# Altium schematic symbol library AliPadash.SchLib: 1186 symbols (part 5 of 6)
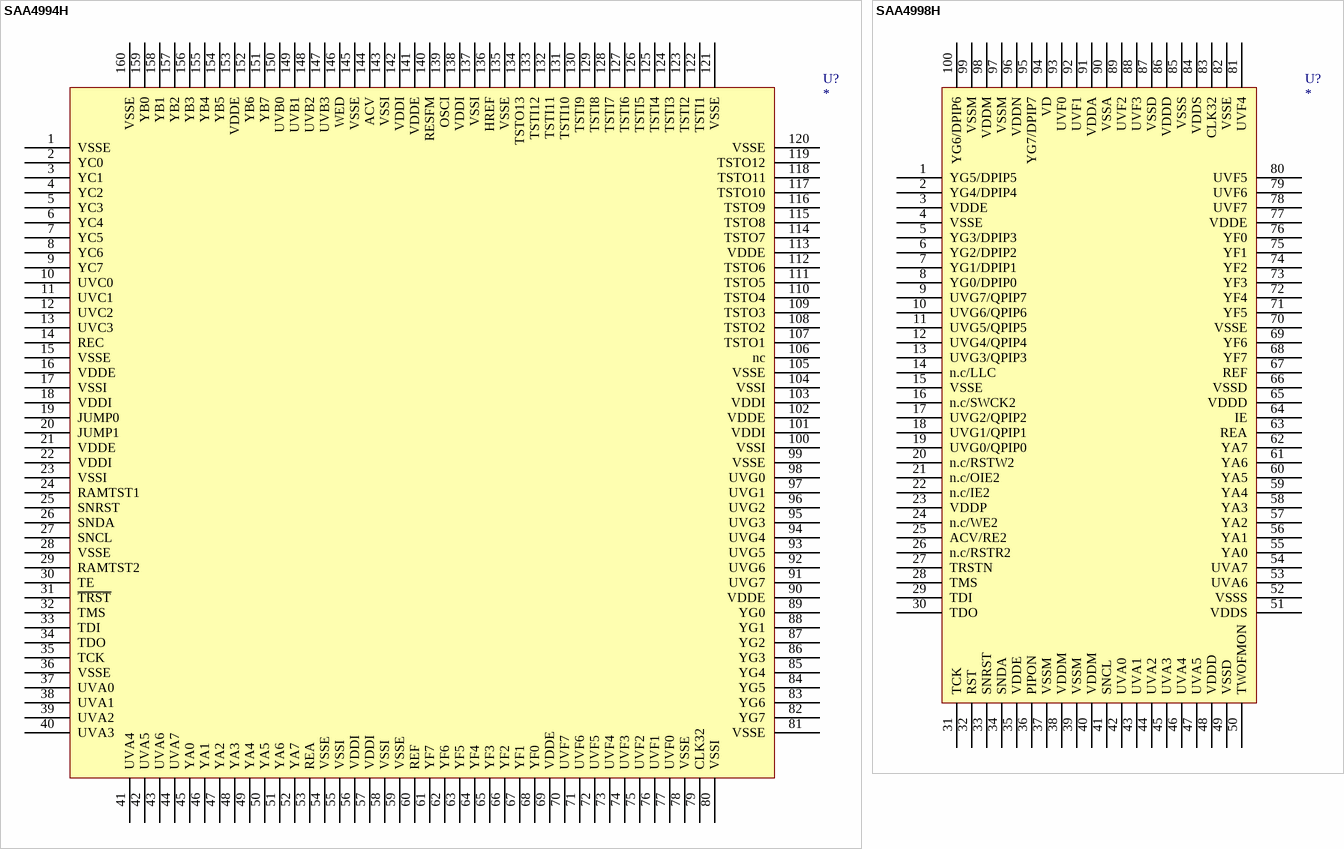
[diagram p90: symbols SAA4994H to SAA4998H]

## SAA4994H
designator U?
footprint QFP-160
pins: 1 VSSE, 2 YC0, 3 YC1, 4 YC2, 5 YC3, 6 YC4, 7 YC5, 8 YC6, 9 YC7, 10 UVC0, 11 UVC1, 12 UVC2, 13 UVC3, 14 REC, 15 VSSE, 16 VDDE, 17 VSSI, 18 VDDI, 19 JUMP0, 20 JUMP1, 21 VDDE, 22 VDDI, 23 VSSI, 24 RAMTST1, 25 SNRST, 26 SNDA, 27 SNCL, 28 VSSE, 29 RAMTST2, 30 TE, 31 ~{TRST}, 32 TMS, 33 TDI, 34 TDO, 35 TCK, 36 VSSE, 37 UVA0, 38 UVA1, 39 UVA2, 40 UVA3, 41 UVA4, 42 UVA5, 43 UVA6, 44 UVA7, 45 YA0, 46 YA1, 47 YA2, 48 YA3, 49 YA4, 50 YA5, 51 YA6, 52 YA7, 53 REA, 54 VSSE, 55 VSSI, 56 VDDI, 57 VDDI, 58 VSSI, 59 VSSE, 60 REF, 61 YF7, 62 YF6, 63 YF5, 64 YF4, 65 YF3, 66 YF2, 67 YF1, 68 YF0, 69 VDDE, 70 UVF7, 71 UVF6, 72 UVF5, 73 UVF4, 74 UVF3, 75 UVF2, 76 UVF1, 77 UVF0, 78 VSSE, 79 CLK32, 80 VSSI, 81 VSSE, 82 YG7, 83 YG6, 84 YG5, 85 YG4, 86 YG3, 87 YG2, 88 YG1, 89 YG0, 90 VDDE, 91 UVG7, 92 UVG6, 93 UVG5, 94 UVG4, 95 UVG3, 96 UVG2, 97 UVG1, 98 UVG0, 99 VSSE, 100 VSSI, 101 VDDI, 102 VDDE, 103 VDDI, 104 VSSI, 105 VSSE, 106 nc, 107 TSTO1, 108 TSTO2, 109 TSTO3, 110 TSTO4, 111 TSTO5, 112 TSTO6, 113 VDDE, 114 TSTO7, 115 TSTO8, 116 TSTO9, 117 TSTO10, 118 TSTO11, 119 TSTO12, 120 VSSE, 121 VSSE, 122 TSTI1, 123 TSTI2, 124 TSTI3, 125 TSTI4, 126 TSTI5, 127 TSTI6, 128 TSTI7, 129 TSTI8, 130 TSTI9, 131 TSTI10, 132 TSTI11, 133 TSTI12, 134 TSTO13, 135 VSSE, 136 HREF, 137 VSSI, 138 VDDI, 139 OSCI, 140 RESFM, 141 VDDE, 142 VDDI, 143 VSSI, 144 ACV, 145 VSSE, 146 WED, 147 UVB3, 148 UVB2, 149 UVB1, 150 UVB0, 151 YB7, 152 YB6, 153 VDDE, 154 YB5, 155 YB4, 156 YB3, 157 YB2, 158 YB1, 159 YB0, 160 VSSE

## SAA4998H
designator U?
footprint SOT317-2
pins: 1 YG5/DPIP5, 2 YG4/DPIP4, 3 VDDE, 4 VSSE, 5 YG3/DPIP3, 6 YG2/DPIP2, 7 YG1/DPIP1, 8 YG0/DPIP0, 9 UVG7/QPIP7, 10 UVG6/QPIP6, 11 UVG5/QPIP5, 12 UVG4/QPIP4, 13 UVG3/QPIP3, 14 n.c/LLC, 15 VSSE, 16 n.c/SWCK2, 17 UVG2/QPIP2, 18 UVG1/QPIP1, 19 UVG0/QPIP0, 20 n.c/RSTW2, 21 n.c/OIE2, 22 n.c/IE2, 23 VDDP, 24 n.c/WE2, 25 ACV/RE2, 26 n.c/RSTR2, 27 TRSTN, 28 TMS, 29 TDI, 30 TDO, 31 TCK, 32 RST, 33 SNRST, 34 SNDA, 35 VDDE, 36 PIPON, 37 VSSM, 38 VDDM, 39 VSSM, 40 VDDM, 41 SNCL, 42 UVA0, 43 UVA1, 44 UVA2, 45 UVA3, 46 UVA4, 47 UVA5, 48 VDDD, 49 VSSD, 50 TWOFMON, 51 VDDS, 52 VSSS, 53 UVA6, 54 UVA7, 55 YA0, 56 YA1, 57 YA2, 58 YA3, 59 YA4, 60 YA5, 61 YA6, 62 YA7, 63 REA, 64 IE, 65 VDDD, 66 VSSD, 67 REF, 68 YF7, 69 YF6, 70 VSSE, 71 YF5, 72 YF4, 73 YF3, 74 YF2, 75 YF1, 76 YF0, 77 VDDE, 78 UVF7, 79 UVF6, 80 UVF5, 81 UVF4, 82 VSSE, 83 CLK32, 84 VDDS, 85 VSSS, 86 VDDD, 87 VSSD, 88 UVF3, 89 UVF2, 90 VSSA, 91 VDDA, 92 UVF1, 93 UVF0, 94 VD, 95 YG7/DPIP7, 96 VDDN, 97 VSSM, 98 VDDM, 99 VSSM, 100 YG6/DPIP6

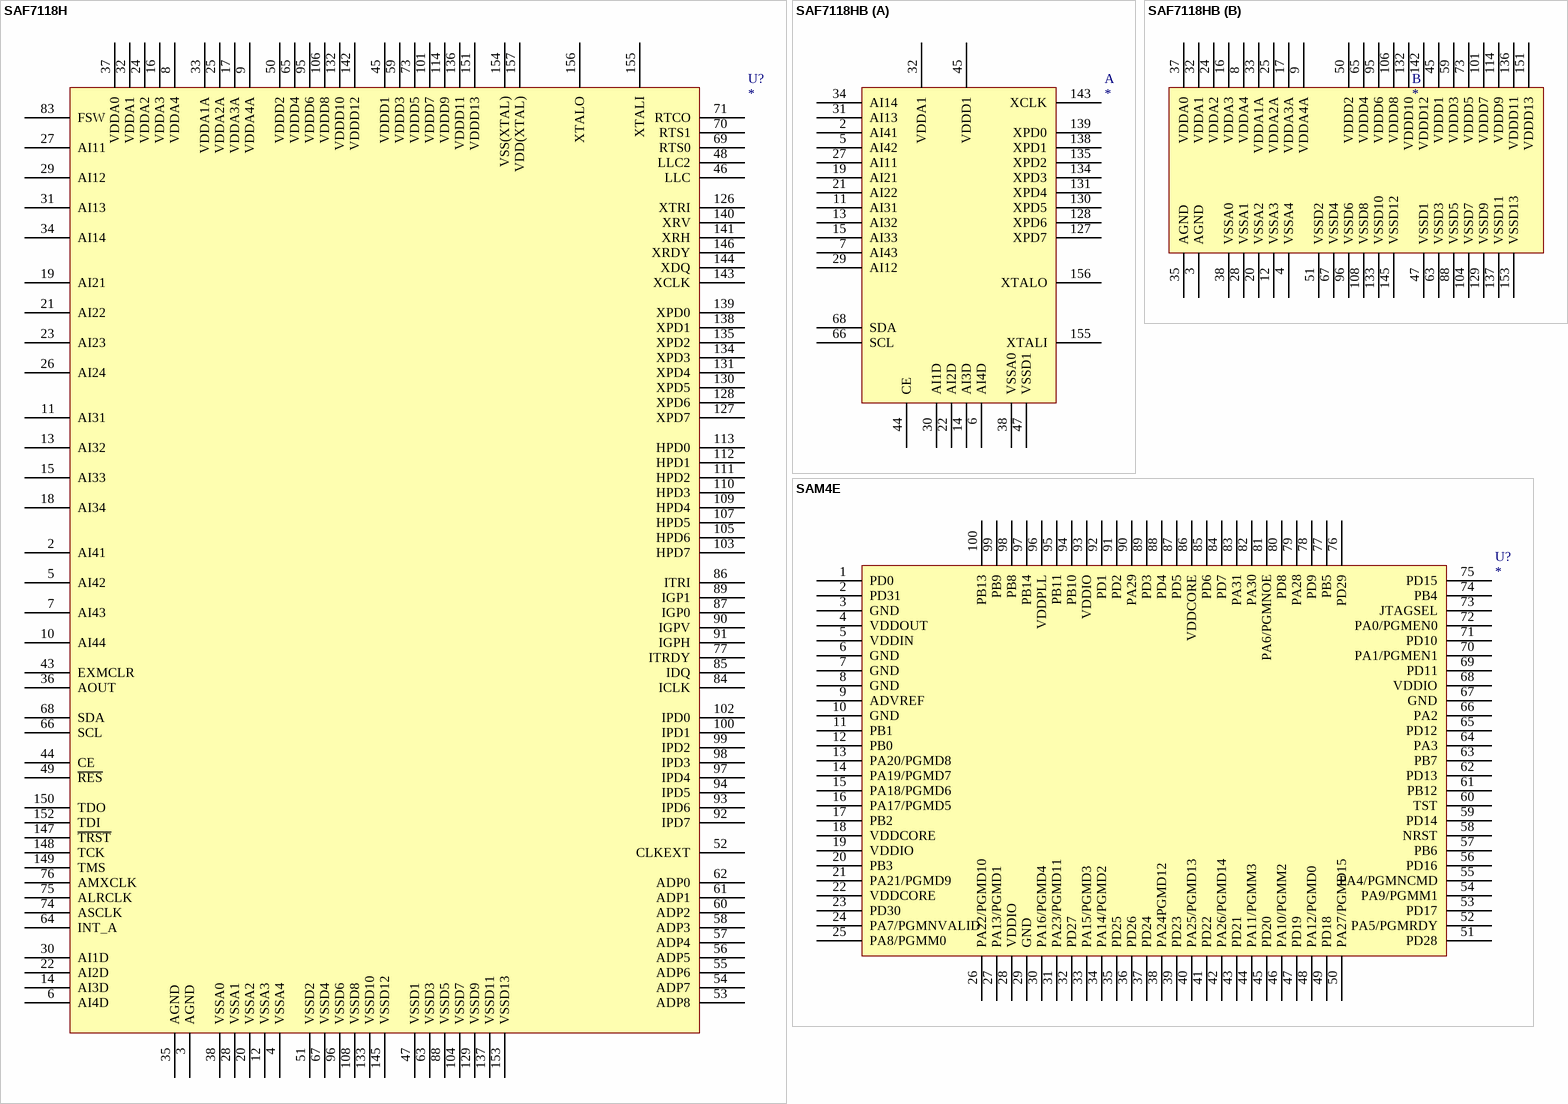
[diagram p56: symbols SAF7118H to SAM4E]

## SAF7118H
designator U?
footprint QFP160
pins: 2 AI41, 3 AGND, 4 VSSA4, 5 AI42, 6 AI4D, 7 AI43, 8 VDDA4, 9 VDDA4A, 10 AI44, 11 AI31, 12 VSSA3, 13 AI32, 14 AI3D, 15 AI33, 16 VDDA3, 17 VDDA3A, 18 AI34, 19 AI21, 20 VSSA2, 21 AI22, 22 AI2D, 23 AI23, 24 VDDA2, 25 VDDA2A, 26 AI24, 27 AI11, 28 VSSA1, 29 AI12, 30 AI1D, 31 AI13, 32 VDDA1, 33 VDDA1A, 34 AI14, 35 AGND, 36 AOUT, 37 VDDA0, 38 VSSA0, 43 EXMCLR, 44 CE, 45 VDDD1, 46 LLC, 47 VSSD1, 48 LLC2, 49 ~{RES}, 50 VDDD2, 51 VSSD2, 52 CLKEXT, 53 ADP8, 54 ADP7, 55 ADP6, 56 ADP5, 57 ADP4, 58 ADP3, 59 VDDD3, 60 ADP2, 61 ADP1, 62 ADP0, 63 VSSD3, 64 INT_A, 65 VDDD4, 66 SCL, 67 VSSD4, 68 SDA, 69 RTS0, 70 RTS1, 71 RTCO, 73 VDDD5, 74 ASCLK, 75 ALRCLK, 76 AMXCLK, 77 ITRDY, 83 FSW, 84 ICLK, 85 IDQ, 86 ITRI, 87 IGP0, 88 VSSD5, 89 IGP1, 90 IGPV, 91 IGPH, 92 IPD7, 93 IPD6, 94 IPD5, 95 VDDD6, 96 VSSD6, 97 IPD4, 98 IPD3, 99 IPD2, 100 IPD1, 101 VDDD7, 102 IPD0, 103 HPD7, 104 VSSD7, 105 HPD6, 106 VDDD8, 107 HPD5, 108 VSSD8, 109 HPD4, 110 HPD3, 111 HPD2, 112 HPD1, 113 HPD0, 114 VDDD9, 126 XTRI, 127 XPD7, 128 XPD6, 129 VSSD9, 130 XPD5, 131 XPD4, 132 VDDD10, 133 VSSD10, 134 XPD3, 135 XPD2, 136 VDDD11, 137 VSSD11, 138 XPD1, 139 XPD0, 140 XRV, 141 XRH, 142 VDDD12, 143 XCLK, 144 XDQ, 145 VSSD12, 146 XRDY, 147 ~{TRST}, 148 TCK, 149 TMS, 150 TDO, 151 VDDD13, 152 TDI, 153 VSSD13, 154 VSS(XTAL), 155 XTALI, 156 XTALO, 157 VDD(XTAL)

## SAF7118HB
designator ?
part A pins: 2 AI41, 5 AI42, 6 AI4D, 7 AI43, 11 AI31, 13 AI32, 14 AI3D, 15 AI33, 19 AI21, 21 AI22, 22 AI2D, 27 AI11, 29 AI12, 30 AI1D, 31 AI13, 32 VDDA1, 34 AI14, 38 VSSA0, 44 CE, 45 VDDD1, 47 VSSD1, 66 SCL, 68 SDA, 127 XPD7, 128 XPD6, 130 XPD5, 131 XPD4, 134 XPD3, 135 XPD2, 138 XPD1, 139 XPD0, 143 XCLK, 155 XTALI, 156 XTALO
part B pins: 3 AGND, 4 VSSA4, 8 VDDA4, 9 VDDA4A, 12 VSSA3, 16 VDDA3, 17 VDDA3A, 20 VSSA2, 24 VDDA2, 25 VDDA2A, 28 VSSA1, 32 VDDA1, 33 VDDA1A, 35 AGND, 37 VDDA0, 38 VSSA0, 45 VDDD1, 47 VSSD1, 50 VDDD2, 51 VSSD2, 59 VDDD3, 63 VSSD3, 65 VDDD4, 67 VSSD4, 73 VDDD5, 88 VSSD5, 95 VDDD6, 96 VSSD6, 101 VDDD7, 104 VSSD7, 106 VDDD8, 108 VSSD8, 114 VDDD9, 129 VSSD9, 132 VDDD10, 133 VSSD10, 136 VDDD11, 137 VSSD11, 142 VDDD12, 145 VSSD12, 151 VDDD13, 153 VSSD13

## SAM4E
designator U?
footprint LQFP100
pins: 1 PD0, 2 PD31, 3 GND, 4 VDDOUT, 5 VDDIN, 6 GND, 7 GND, 8 GND, 9 ADVREF, 10 GND, 11 PB1, 12 PB0, 13 PA20/PGMD8, 14 PA19/PGMD7, 15 PA18/PGMD6, 16 PA17/PGMD5, 17 PB2, 18 VDDCORE, 19 VDDIO, 20 PB3, 21 PA21/PGMD9, 22 VDDCORE, 23 PD30, 24 PA7/PGMNVALID, 25 PA8/PGMM0, 26 PA22/PGMD10, 27 PA13/PGMD1, 28 VDDIO, 29 GND, 30 PA16/PGMD4, 31 PA23/PGMD11, 32 PD27, 33 PA15/PGMD3, 34 PA14/PGMD2, 35 PD25, 36 PD26, 37 PD24, 38 PA24PGMD12, 39 PD23, 40 PA25/PGMD13, 41 PD22, 42 PA26/PGMD14, 43 PD21, 44 PA11/PGMM3, 45 PD20, 46 PA10/PGMM2, 47 PD19, 48 PA12/PGMD0, 49 PD18, 50 PA27/PGMD15, 51 PD28, 52 PA5/PGMRDY, 53 PD17, 54 PA9/PGMM1, 55 PA4/PGMNCMD, 56 PD16, 57 PB6, 58 NRST, 59 PD14, 60 TST, 61 PB12, 62 PD13, 63 PB7, 64 PA3, 65 PD12, 66 PA2, 67 GND, 68 VDDIO, 69 PD11, 70 PA1/PGMEN1, 71 PD10, 72 PA0/PGMEN0, 73 JTAGSEL, 74 PB4, 75 PD15, 76 PD29, 77 PB5, 78 PD9, 79 PA28, 80 PD8, 81 PA6/PGMNOE, 82 PA30, 83 PA31, 84 PD7, 85 PD6, 86 VDDCORE, 87 PD5, 88 PD4, 89 PD3, 90 PA29, 91 PD2, 92 PD1, 93 VDDIO, 94 PB10, 95 PB11, 96 VDDPLL, 97 PB14, 98 PB8, 99 PB9, 100 PB13

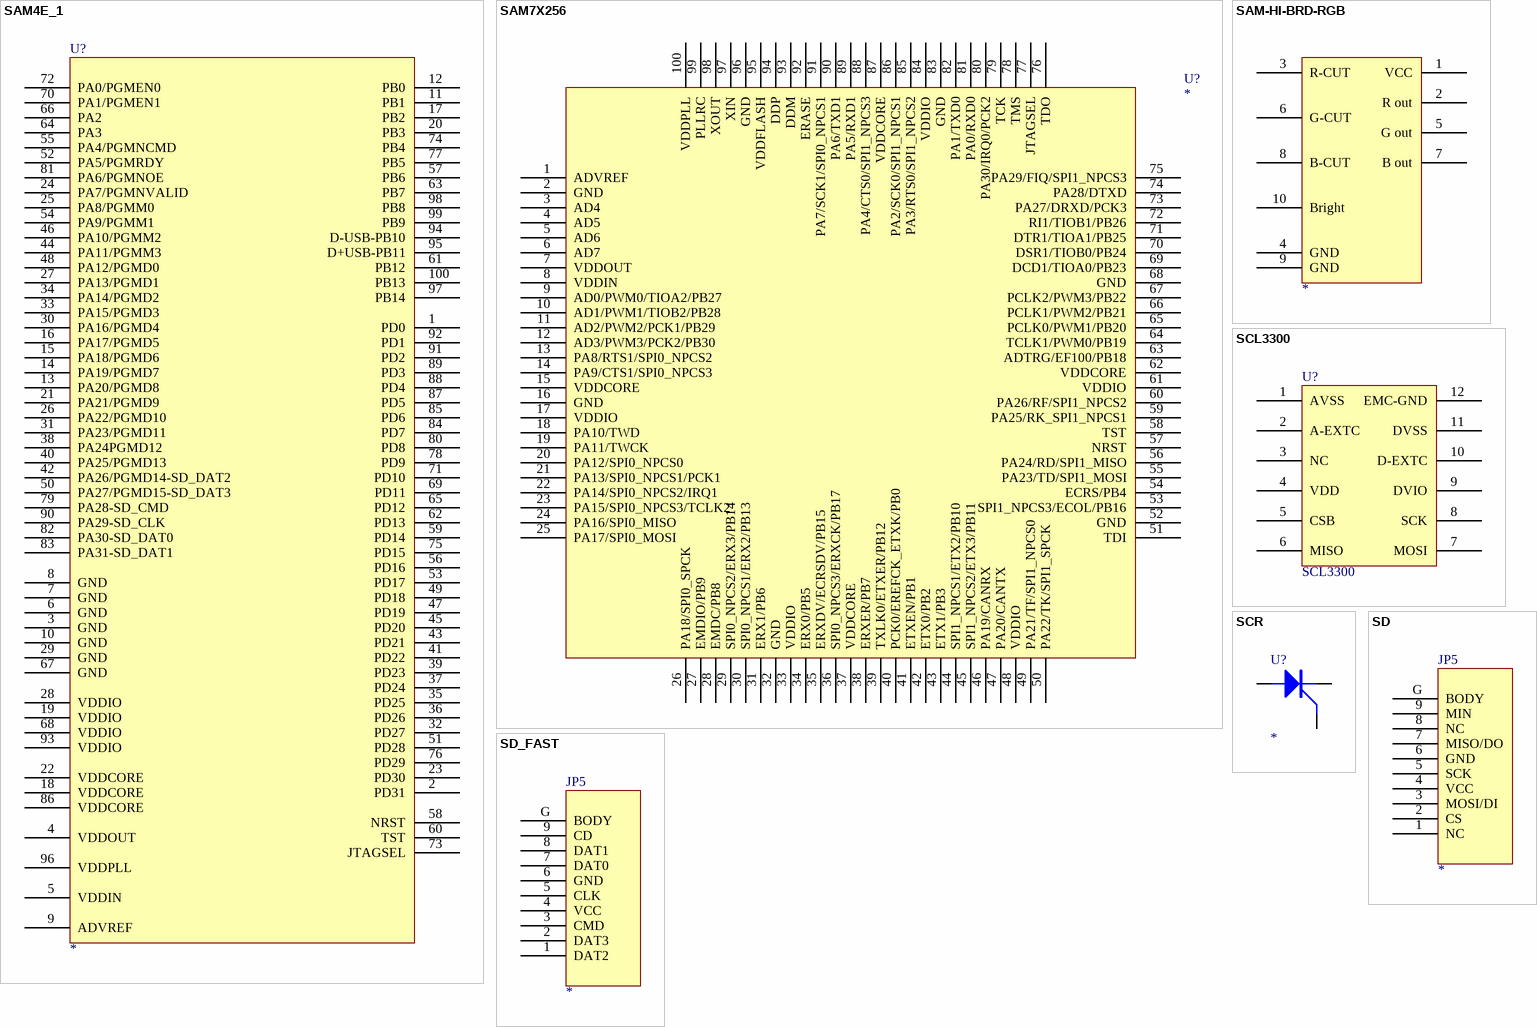
[diagram p57: symbols SAM4E_1 to SD_FAST]

## SAM4E_1
designator U?
footprint LQFP100
pins: 1 PD0, 2 PD31, 3 GND, 4 VDDOUT, 5 VDDIN, 6 GND, 7 GND, 8 GND, 9 ADVREF, 10 GND, 11 PB1, 12 PB0, 13 PA20/PGMD8, 14 PA19/PGMD7, 15 PA18/PGMD6, 16 PA17/PGMD5, 17 PB2, 18 VDDCORE, 19 VDDIO, 20 PB3, 21 PA21/PGMD9, 22 VDDCORE, 23 PD30, 24 PA7/PGMNVALID, 25 PA8/PGMM0, 26 PA22/PGMD10, 27 PA13/PGMD1, 28 VDDIO, 29 GND, 30 PA16/PGMD4, 31 PA23/PGMD11, 32 PD27, 33 PA15/PGMD3, 34 PA14/PGMD2, 35 PD25, 36 PD26, 37 PD24, 38 PA24PGMD12, 39 PD23, 40 PA25/PGMD13, 41 PD22, 42 PA26/PGMD14-SD_DAT2, 43 PD21, 44 PA11/PGMM3, 45 PD20, 46 PA10/PGMM2, 47 PD19, 48 PA12/PGMD0, 49 PD18, 50 PA27/PGMD15-SD_DAT3, 51 PD28, 52 PA5/PGMRDY, 53 PD17, 54 PA9/PGMM1, 55 PA4/PGMNCMD, 56 PD16, 57 PB6, 58 NRST, 59 PD14, 60 TST, 61 PB12, 62 PD13, 63 PB7, 64 PA3, 65 PD12, 66 PA2, 67 GND, 68 VDDIO, 69 PD11, 70 PA1/PGMEN1, 71 PD10, 72 PA0/PGMEN0, 73 JTAGSEL, 74 PB4, 75 PD15, 76 PD29, 77 PB5, 78 PD9, 79 PA28-SD_CMD, 80 PD8, 81 PA6/PGMNOE, 82 PA30-SD_DAT0, 83 PA31-SD_DAT1, 84 PD7, 85 PD6, 86 VDDCORE, 87 PD5, 88 PD4, 89 PD3, 90 PA29-SD_CLK, 91 PD2, 92 PD1, 93 VDDIO, 94 D-USB-PB10, 95 D+USB-PB11, 96 VDDPLL, 97 PB14, 98 PB8, 99 PB9, 100 PB13

## SAM7X256
designator U?
pins: 1 ADVREF, 2 GND, 3 AD4, 4 AD5, 5 AD6, 6 AD7, 7 VDDOUT, 8 VDDIN, 9 AD0/PWM0/TIOA2/PB27, 10 AD1/PWM1/TIOB2/PB28, 11 AD2/PWM2/PCK1/PB29, 12 AD3/PWM3/PCK2/PB30, 13 PA8/RTS1/SPI0_NPCS2, 14 PA9/CTS1/SPI0_NPCS3, 15 VDDCORE, 16 GND, 17 VDDIO, 18 PA10/TWD, 19 PA11/TWCK, 20 PA12/SPI0_NPCS0, 21 PA13/SPI0_NPCS1/PCK1, 22 PA14/SPI0_NPCS2/IRQ1, 23 PA15/SPI0_NPCS3/TCLK2, 24 PA16/SPI0_MISO, 25 PA17/SPI0_MOSI, 26 PA18/SPI0_SPCK, 27 EMDIO/PB9, 28 EMDC/PB8, 29 SPI0_NPCS2/ERX3/PB14, 30 SPI0_NPCS1/ERX2/PB13, 31 ERX1/PB6, 32 GND, 33 VDDIO, 34 ERX0/PB5, 35 ERXDV/ECRSDV/PB15, 36 SPI0_NPCS3/ERXCK/PB17, 37 VDDCORE, 38 ERXER/PB7, 39 TXLK0/ETXER/PB12, 40 PCK0/EREFCK_ETXK/PB0, 41 ETXEN/PB1, 42 ETX0/PB2, 43 ETX1/PB3, 44 SPI1_NPCS1/ETX2/PB10, 45 SPI1_NPCS2/ETX3/PB11, 46 PA19/CANRX, 47 PA20/CANTX, 48 VDDIO, 49 PA21/TF/SPI1_NPCS0, 50 PA22/TK/SPI1_SPCK, 51 TDI, 52 GND, 53 SPI1_NPCS3/ECOL/PB16, 54 ECRS/PB4, 55 PA23/TD/SPI1_MOSI, 56 PA24/RD/SPI1_MISO, 57 NRST, 58 TST, 59 PA25/RK_SPI1_NPCS1, 60 PA26/RF/SPI1_NPCS2, 61 VDDIO, 62 VDDCORE, 63 ADTRG/EF100/PB18, 64 TCLK1/PWM0/PB19, 65 PCLK0/PWM1/PB20, 66 PCLK1/PWM2/PB21, 67 PCLK2/PWM3/PB22, 68 GND, 69 DCD1/TIOA0/PB23, 70 DSR1/TIOB0/PB24, 71 DTR1/TIOA1/PB25, 72 RI1/TIOB1/PB26, 73 PA27/DRXD/PCK3, 74 PA28/DTXD, 75 PA29/FIQ/SPI1_NPCS3, 76 TDO, 77 JTAGSEL, 78 TMS, 79 TCK, 80 PA30/IRQ0/PCK2, 81 PA0/RXD0, 82 PA1/TXD0, 83 GND, 84 VDDIO, 85 PA3/RTS0/SPI1_NPCS2, 86 PA2/SCK0/SPI1_NPCS1, 87 VDDCORE, 88 PA4/CTS0/SPI1_NPCS3, 89 PA5/RXD1, 90 PA6/TXD1, 91 PA7/SCK1/SPI0_NPCS1, 92 ERASE, 93 DDM, 94 DDP, 95 VDDFLASH, 96 GND, 97 XIN, 98 XOUT, 99 PLLRC, 100 VDDPLL

## SAM-HI-BRD-RGB
designator ?
pins: 1 VCC, 2 R out, 3 R-CUT, 4 GND, 5 G out, 6 G-CUT, 7 B out, 8 B-CUT, 9 GND, 10 Bright

## SCL3300
designator U?
Tilt Sensor
footprint SCL3300
pins: 1 AVSS, 2 A-EXTC, 3 NC, 4 VDD, 5 CSB, 6 MISO, 7 MOSI, 8 SCK, 9 DVIO, 10 D-EXTC, 11 DVSS, 12 EMC-GND

## SCR
designator U?
footprint SCR2
pins: A, G, K

## SD
designator JP5
footprint SDCARD1
pins: 1 NC, 2 CS, 3 MOSI/DI, 4 VCC, 5 SCK, 6 GND, 7 MISO/DO, 8 NC, 9 MIN, G BODY
2 alternate drawings of the same symbol

## SD_FAST
designator JP5
footprint SDCARD1
pins: 1 DAT2, 2 DAT3, 3 CMD, 4 VCC, 5 CLK, 6 GND, 7 DAT0, 8 DAT1, 9 CD, G BODY
2 alternate drawings of the same symbol

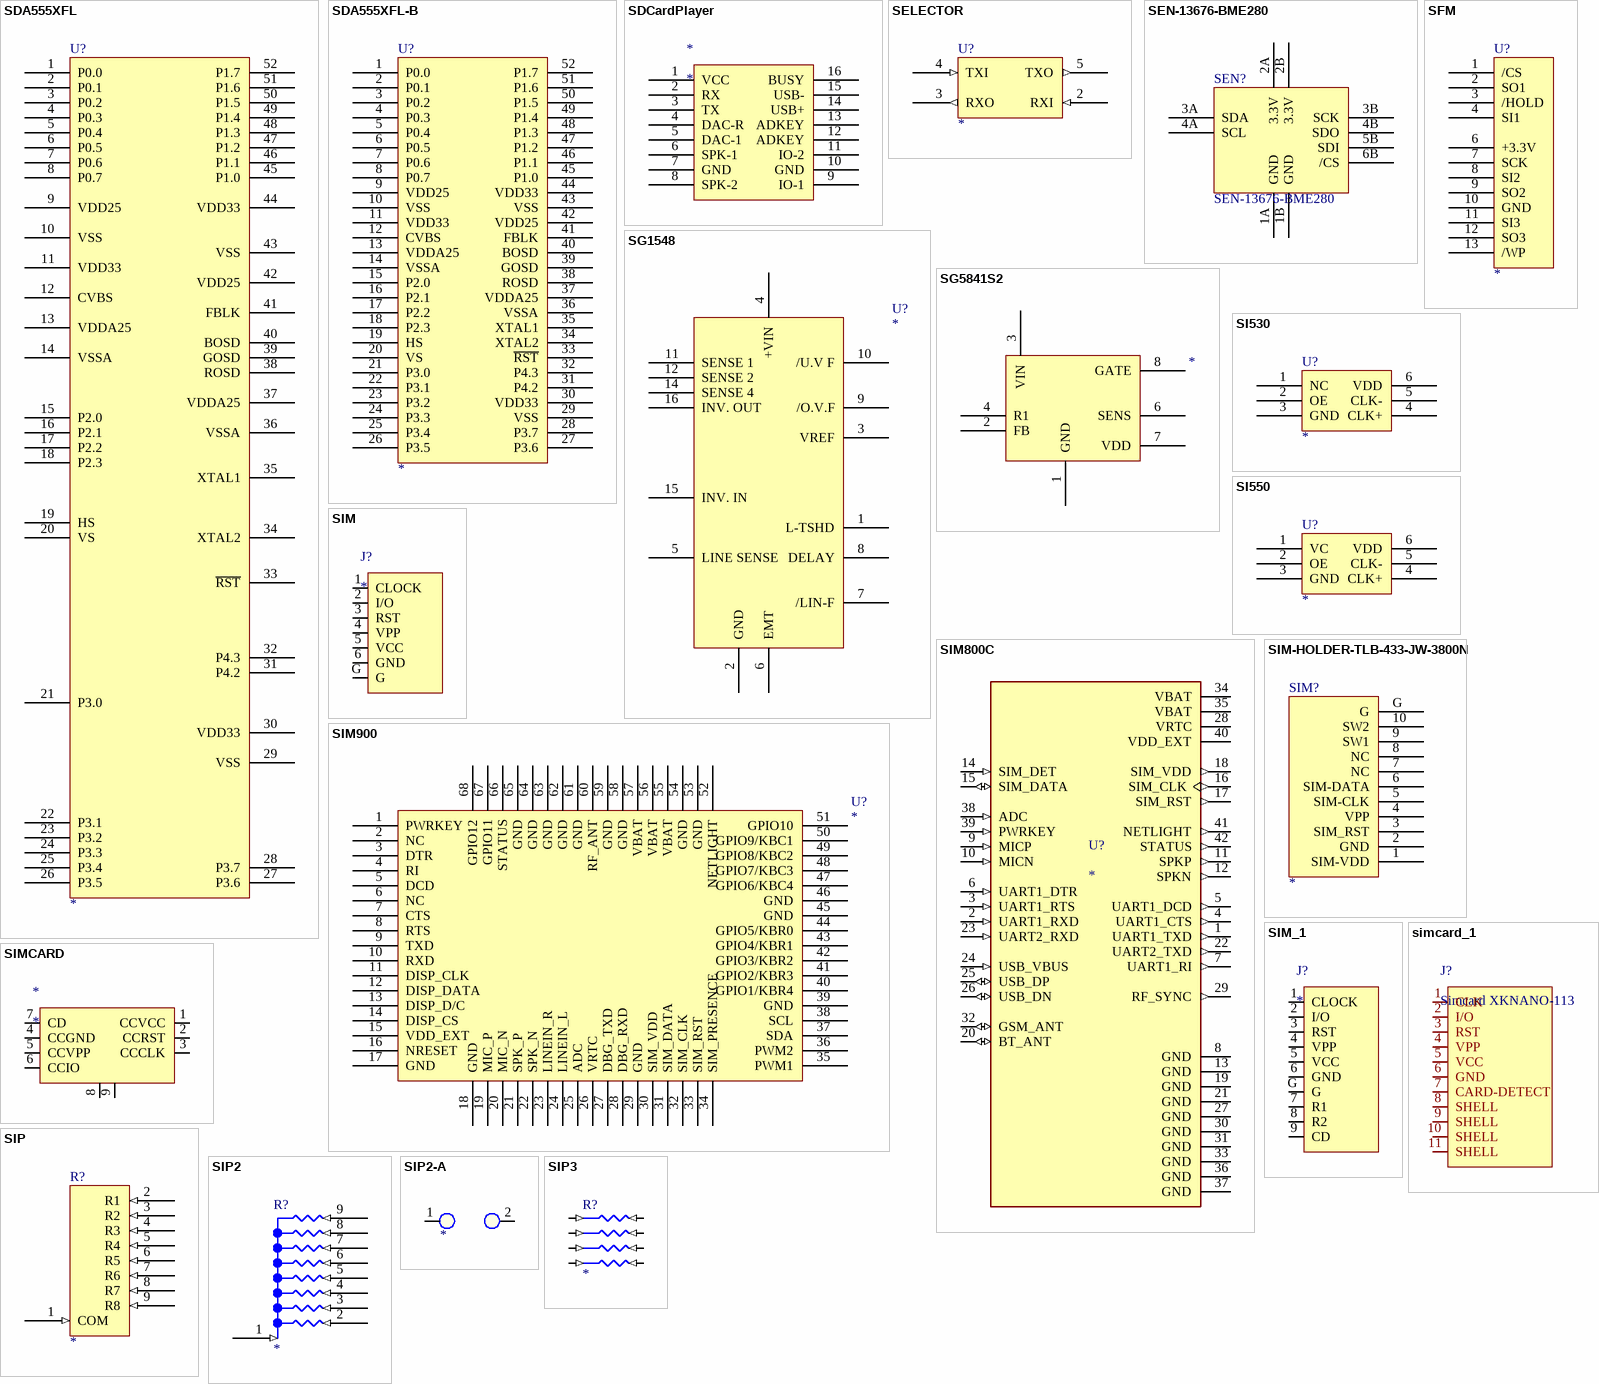
[diagram p58: symbols SDA555XFL to SIP3]

## SDA555XFL
designator U?
TVText Pro
footprint DIL52
pins: 1 P0.0, 2 P0.1, 3 P0.2, 4 P0.3, 5 P0.4, 6 P0.5, 7 P0.6, 8 P0.7, 9 VDD25, 10 VSS, 11 VDD33, 12 CVBS, 13 VDDA25, 14 VSSA, 15 P2.0, 16 P2.1, 17 P2.2, 18 P2.3, 19 HS, 20 VS, 21 P3.0, 22 P3.1, 23 P3.2, 24 P3.3, 25 P3.4, 26 P3.5, 27 P3.6, 28 P3.7, 29 VSS, 30 VDD33, 31 P4.2, 32 P4.3, 33 ~{RST}, 34 XTAL2, 35 XTAL1, 36 VSSA, 37 VDDA25, 38 ROSD, 39 GOSD, 40 BOSD, 41 FBLK, 42 VDD25, 43 VSS, 44 VDD33, 45 P1.0, 46 P1.1, 47 P1.2, 48 P1.3, 49 P1.4, 50 P1.5, 51 P1.6, 52 P1.7

## SDA555XFL-B
designator U?
footprint DIL52
pins: 1 P0.0, 2 P0.1, 3 P0.2, 4 P0.3, 5 P0.4, 6 P0.5, 7 P0.6, 8 P0.7, 9 VDD25, 10 VSS, 11 VDD33, 12 CVBS, 13 VDDA25, 14 VSSA, 15 P2.0, 16 P2.1, 17 P2.2, 18 P2.3, 19 HS, 20 VS, 21 P3.0, 22 P3.1, 23 P3.2, 24 P3.3, 25 P3.4, 26 P3.5, 27 P3.6, 28 P3.7, 29 VSS, 30 VDD33, 31 P4.2, 32 P4.3, 33 ~{RST}, 34 XTAL2, 35 XTAL1, 36 VSSA, 37 VDDA25, 38 ROSD, 39 GOSD, 40 BOSD, 41 FBLK, 42 VDD25, 43 VSS, 44 VDD33, 45 P1.0, 46 P1.1, 47 P1.2, 48 P1.3, 49 P1.4, 50 P1.5, 51 P1.6, 52 P1.7

## SDCardPlayer
designator *
pins: 1 VCC, 2 RX, 3 TX, 4 DAC-R, 5 DAC-1, 6 SPK-1, 7 GND, 8 SPK-2, 9 IO-1, 10 GND, 11 IO-2, 12 ADKEY, 13 ADKEY, 14 USB+, 15 USB-, 16 BUSY

## SELECTOR
designator U?
pins: 2 RXI (in), 3 RXO (out), 4 TXI (in), 5 TXO (out)

## SEN-13676-BME280
designator SEN?
footprint sen-bme280
pins: 1A GND, 1B GND, 2A 3.3V, 2B 3.3V, 3A SDA, 3B SCK, 4A SCL, 4B SDO, 5B SDI, 6B /CS

## SFM
designator U?
footprint SFM
pins: 1 /CS, 2 SO1, 3 /HOLD, 4 SI1, 6 +3.3V, 7 SCK, 8 SI2, 9 SO2, 10 GND, 11 SI3, 12 SO3, 13 /WP

## SG1548
designator U?
footprint SOL-16
pins: 1 L-TSHD, 2 GND, 3 VREF, 4 +VIN, 5 LINE SENSE, 6 EMT, 7 /LIN-F, 8 DELAY, 9 /O.V.F, 10 /U.V F, 11 SENSE 1, 12 SENSE 2, 14 SENSE 4, 15 INV. IN, 16 INV. OUT

## SG5841S2
designator ?
pins: 1 GND, 2 FB, 3 VIN, 4 R1, 6 SENS, 7 VDD, 8 GATE

## SI530
designator U?
footprint LP6
pins: 1 NC, 2 OE, 3 GND, 4 CLK+, 5 CLK-, 6 VDD

## SI550
designator U?
footprint LP6
pins: 1 VC, 2 OE, 3 GND, 4 CLK+, 5 CLK-, 6 VDD

## SIM
designator J?
footprint SIM-HOLDER-SMD
pins: 1 CLOCK, 2 I/O, 3 RST, 4 VPP, 5 VCC, 6 GND, G

## SIM800C
designator U?
Module: GSM/Bluetooth; GPRS; 2G; 1800MHz, 900MHz; 85.6kbps; SMD; MP: SIM800C; MF: Simcom; Check_prices: https://www.snapeda.com/parts/SIM800C/SIMcom+Wireless+solutions+Co.%252CLtd/view-part/?ref=eda; Value: *; Availability: In Stock; Price: None; Package: None; SnapEDA_Link: https://www.snapeda.com/parts/SIM800C/SIMcom+Wireless+solutions+Co.%252CLtd/view-part/?ref=snap
footprint LCC110P1570X1760X250-42N
pins: 1 UART1_TXD (out), 2 UART1_RXD (in), 3 UART1_RTS (in), 4 UART1_CTS (out), 5 UART1_DCD (out), 6 UART1_DTR (in), 7 UART1_RI (out), 8 GND (power), 9 MICP (in), 10 MICN (in), 11 SPKP (out), 12 SPKN (out), 13 GND (power), 14 SIM_DET (in), 15 SIM_DATA (io), 16 SIM_CLK (out), 17 SIM_RST (out), 18 SIM_VDD (out), 19 GND (power), 20 BT_ANT (io), 21 GND (power), 22 UART2_TXD (out), 23 UART2_RXD (in), 24 USB_VBUS (in), 25 USB_DP (io), 26 USB_DN (io), 27 GND (power), 28 VRTC (power), 29 RF_SYNC (out), 30 GND (power), 31 GND (power), 32 GSM_ANT (io), 33 GND (power), 34 VBAT (power), 35 VBAT (power), 36 GND (power), 37 GND (power), 38 ADC (in), 39 PWRKEY (in), 40 VDD_EXT (power), 41 NETLIGHT (out), 42 STATUS (out)

## SIM900
designator U?
footprint SIM900-68P
pins: 1 PWRKEY, 2 NC, 3 DTR, 4 RI, 5 DCD, 6 NC, 7 CTS, 8 RTS, 9 TXD, 10 RXD, 11 DISP_CLK, 12 DISP_DATA, 13 DISP_D/C, 14 DISP_CS, 15 VDD_EXT, 16 NRESET, 17 GND, 18 GND, 19 MIC_P, 20 MIC_N, 21 SPK_P, 22 SPK_N, 23 LINEIN_R, 24 LINEIN_L, 25 ADC, 26 VRTC, 27 DBG_TXD, 28 DBG_RXD, 29 GND, 30 SIM_VDD, 31 SIM_DATA, 32 SIM_CLK, 33 SIM_RST, 34 SIM_PRESENCE, 35 PWM1, 36 PWM2, 37 SDA, 38 SCL, 39 GND, 40 GPIO1/KBR4, 41 GPIO2/KBR3, 42 GPIO3/KBR2, 43 GPIO4/KBR1, 44 GPIO5/KBR0, 45 GND, 46 GND, 47 GPIO6/KBC4, 48 GPIO7/KBC3, 49 GPIO8/KBC2, 50 GPIO9/KBC1, 51 GPIO10, 52 NETLIGHT, 53 GND, 54 GND, 55 VBAT, 56 VBAT, 57 VBAT, 58 GND, 59 GND, 60 RF_ANT, 61 GND, 62 GND, 63 GND, 64 GND, 65 GND, 66 STATUS, 67 GPIO11, 68 GPIO12

## SIM-HOLDER-TLB-433-JW-3800N
designator SIM?
footprint SIM-HOLDER
pins: 1 SIM-VDD, 2 GND, 3 SIM_RST, 4 VPP, 5 SIM-CLK, 6 SIM-DATA, 7 NC, 8 NC, 9 SW1, 10 SW2, G

## SIM_1
designator J?
footprint SIM-HOLDERV2
pins: 1 CLOCK, 2 I/O, 3 RST, 4 VPP, 5 VCC, 6 GND, 7 R1, 8 R2, 9 CD, G

## SIMCARD
designator *
pins: 1 CCVCC, 2 CCRST, 3 CCCLK, 4 CCGND, 5 CCVPP, 6 CCIO, 7 CD, 8, 9

## simcard_1
designator J?, comment Simcard XKNANO-113
JLC: C381071; MFAC: XKNANO-113
pins: 1 CLK, 2 I/O, 3 RST, 4 VPP, 5 VCC, 6 GND, 7 CARD-DETECT, 8 SHELL, 9 SHELL, 10 SHELL, 11 SHELL

## SIP
designator R?
pins: 1 COM (in), 2 R1 (in), 3 R2 (in), 4 R3 (in), 5 R4 (in), 6 R5 (in), 7 R6 (in), 8 R7 (in), 9 R8 (in)

## SIP2
designator R?
footprint SIP9
pins: 1 R1 (in), 2 R2 (in), 3 R3 (in), 4 R4 (in), 5 R5 (in), 6 R6 (in), 7 R7 (in), 8 R8 (in), 9 COM (in)

## SIP2-A
designator ?
pins: 1, 2

## SIP3
designator R?
footprint SIP8-0603
pins: 1 R1 (in), 2 R2 (in), 3 R3 (in), 4 R4 (in), 5 R5 (in), 6 R6 (in), 7 R7 (in), 8 R8 (in)
